# Altium footprint library RPSLib_orignal.PcbLib: 199 footprints (part 10 of 13)
Each footprint in its own frame and in the unit in brackets; x right, y up, seen from the top. Pads: shape width x height; smd on the part's side, far side on the other; paste and mask are expansions set on the pad; w line width, h text height; cw(c..) or ccw(c..) is an arc to the next point about the centre after c.
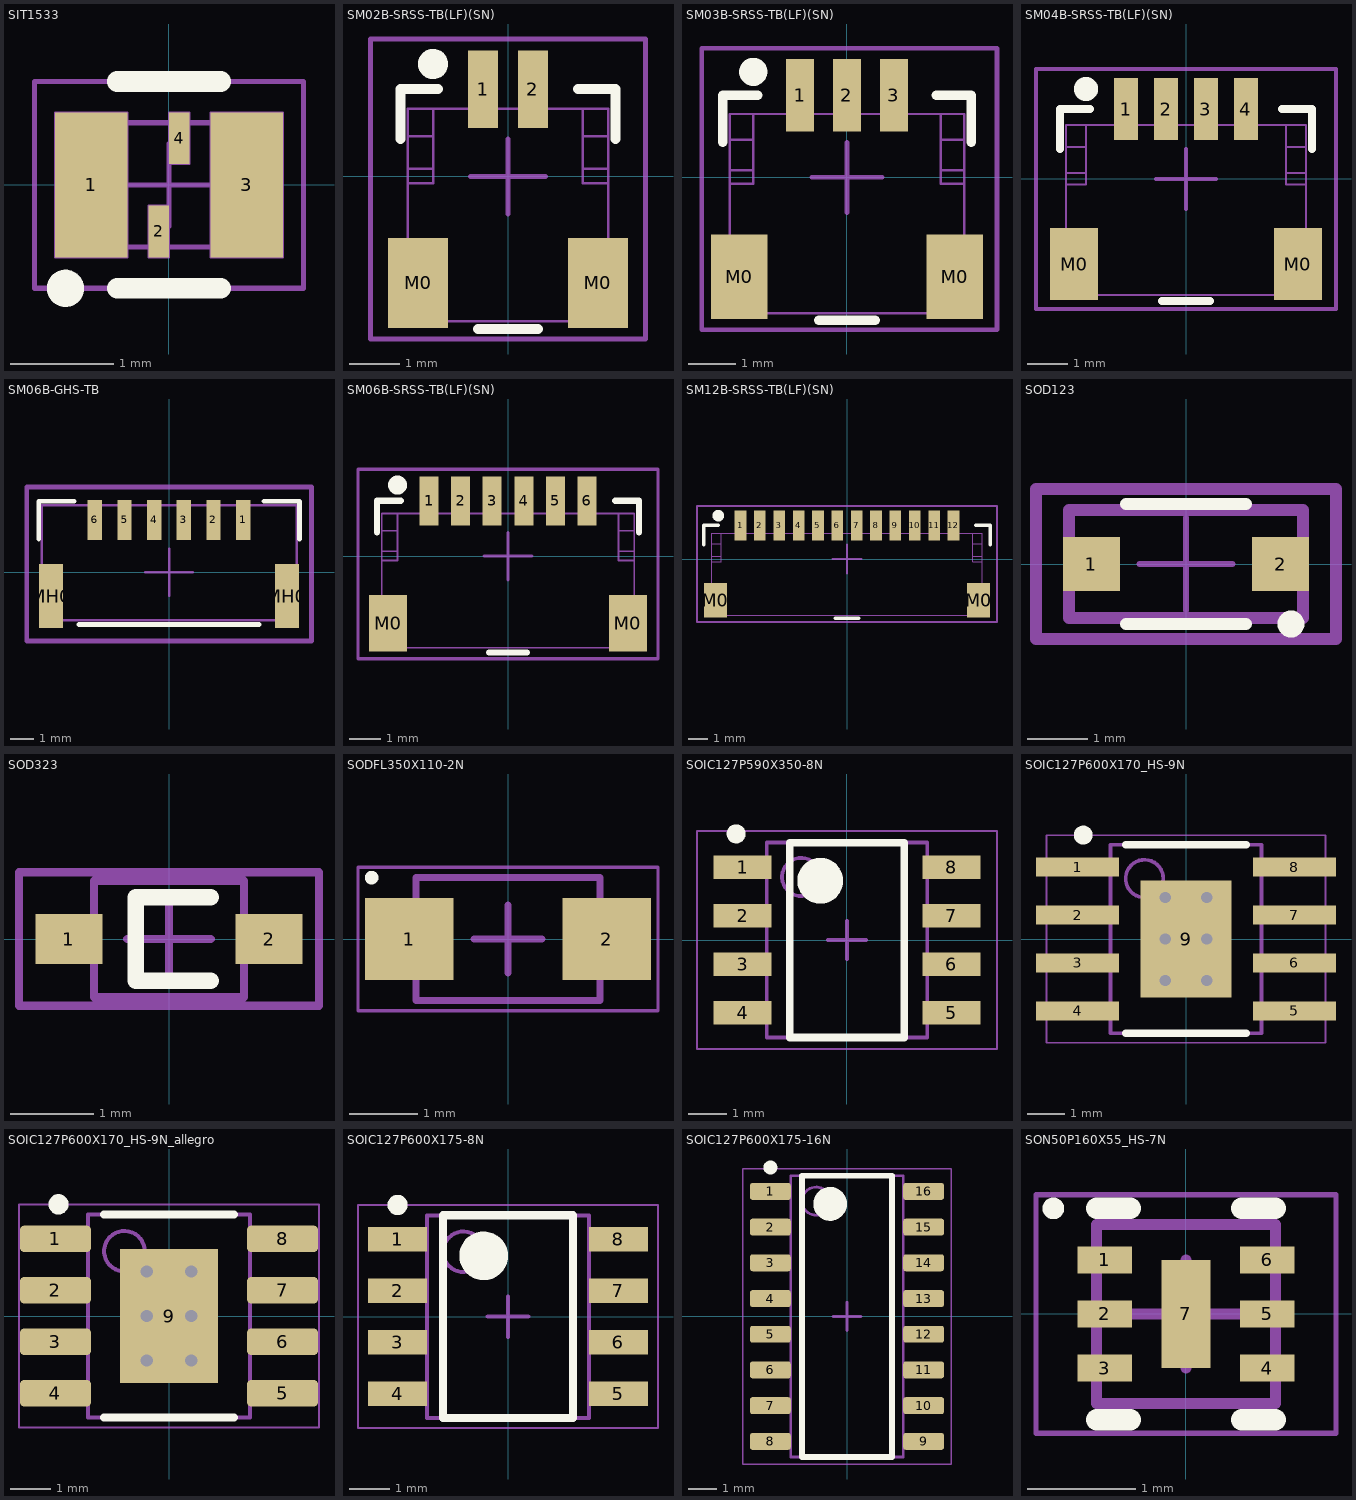
[diagram p9: the footprints below, top view; thin cyan lines are the x and y axes]

## SIT1533 [mm]
height 0.6
pads (4):
  rect 0.7x1.4 smd mask+0.07: 1(-0.75,0) 3(0.75,0)
  rect 0.2x0.5 smd mask+0.07: 2(-0.1,-0.45) 4(0.1,0.45)
Top Overlay:
  circle w0.2: c-1,-1 r0.08
  lines w0.2: -0.5,-1 0.5,-1 ; -0.5,1 0.5,1
Mechanical 1:
  lines w0.02: -1.1,-0.7 -0.4,0.7 ; -1.1,-0.7 -1.1,0.7 ; -1.1,-0.7 -0.4,-0.7 ; -1.1,0.7 -0.4,-0.7 ; -1.1,0.7 -0.4,0.7 ; -0.4,-0.7 -0.4,0.7 ; -0.2,-0.7 0,-0.2 ; -0.2,-0.7 -0.2,-0.2 ; -0.2,-0.7 0,-0.7 ; -0.2,-0.2 0,-0.7 ; -0.2,-0.2 0,-0.2 ; 0,-0.7 0,-0.2 ; 0,0.2 0.2,0.7 ; 0,0.2 0,0.7 ; 0,0.2 0.2,0.2 ; 0,0.7 0.2,0.2 ; 0,0.7 0.2,0.7 ; 0.2,0.2 0.2,0.7 ; 0.4,-0.7 1.1,0.7 ; 0.4,-0.7 0.4,0.7 ; 0.4,-0.7 1.1,-0.7 ; 0.4,0.7 1.1,-0.7 ; 0.4,0.7 1.1,0.7 ; 1.1,-0.7 1.1,0.7
Mechanical 13:
  lines w0.05: -1,-0.6 1,-0.6 1,0.6 -1,0.6 -1,-0.6
Mechanical 15:
  lines w0.05: -0.4,0 0.4,0 ; 0,-0.4 0,0.4 ; -1.3,-1 1.3,-1 1.3,1 -1.3,1 -1.3,-1
3D body "SIT1533.stp": height 0.6, standoff 0, extent -1,-0.6 1,0.6

## SM02B-SRSS-TB(LF)(SN) [mm] "JST 1.0 mm pitch connector"
height 3
pads (4):
  rect 0.6x1.55 smd mask+0.07: 1(-0.5,1.75) 2(0.5,1.75)
  rect 1.2x1.8 smd mask+0.07: M0(-1.8,-2.125) M0(1.8,-2.125)
Top Overlay:
  circle w0.4: c-1.5,2.25 r0.1
  lines w0.2: -2.15,0.75 -2.15,1.75 -1.4,1.75 ; -0.6,-3.05 0.6,-3.05 ; 1.4,1.75 2.15,1.75 2.15,0.75
Mechanical 13:
  lines w0.05: -1.5,0.15 -2,0.15 ; -1.5,0.8 -2,0.8 ; -0.6,1.35 -0.6,2.05 -0.4,2.05 -0.4,1.35 ; 0.4,1.35 0.4,2.05 0.6,2.05 0.6,1.35 ; 1.5,0.15 2,0.15 ; 1.5,0.8 2,0.8 ; -2,-0.139 -2,-2.9 2,-2.9 2,-0.139 ; -2,-0.139 -2,0.15 ; -2,-0.139 -1.5,-0.139 -1.5,1.35 ; -2,0.15 -2,0.8 ; -2,0.8 -2,1.35 -1.5,1.35 ; -1.5,1.35 1.5,1.35 ; 1.5,1.35 1.5,-0.139 2,-0.139 ; 1.5,1.35 2,1.35 2,0.8 ; 2,-0.139 2,0.15 ; 2,0.15 2,0.8
Mechanical 15:
  lines w0.1: -0.75,0 0.75,0 ; 0,-0.75 0,0.75 ; -2.75,-3.25 2.75,-3.25 2.75,2.75 -2.75,2.75 -2.75,-3.25
3D body "SM02B-SRSS-TB.STEP": height 2.96, standoff 0, extent -2,-2.895 2,2.055

## SM03B-SRSS-TB(LF)(SN) [mm] "JST 1.0 mm pitch connector"
height 3
pads (5):
  rect 0.6x1.55 smd mask+0.07: 1(-1,1.75) 2(0,1.75) 3(1,1.75)
  rect 1.2x1.8 smd mask+0.07: M0(-2.3,-2.125) M0(2.3,-2.125)
Top Overlay:
  circle w0.4: c-2,2.25 r0.1
  lines w0.2: -2.65,0.75 -2.65,1.75 -1.9,1.75 ; -0.6,-3.05 0.6,-3.05 ; 1.9,1.75 2.65,1.75 2.65,0.75
Mechanical 13:
  lines w0.05: -2,0.15 -2.5,0.15 ; -2,0.8 -2.5,0.8 ; -1.1,1.35 -1.1,2.05 -0.9,2.05 -0.9,1.35 ; -0.1,1.35 -0.1,2.05 0.1,2.05 0.1,1.35 ; 0.9,1.35 0.9,2.05 1.1,2.05 1.1,1.35 ; 2,0.15 2.5,0.15 ; 2,0.8 2.5,0.8 ; -2.5,-0.139 -2,-0.139 -2,1.35 ; -2.5,-0.139 -2.5,-2.9 2.5,-2.9 2.5,-0.139 ; -2.5,-0.139 -2.5,0.15 ; -2.5,0.15 -2.5,0.8 ; -2.5,0.8 -2.5,1.35 -2,1.35 ; -2,1.35 2,1.35 ; 2,1.35 2.5,1.35 2.5,0.8 ; 2,1.35 2,-0.139 2.5,-0.139 ; 2.5,-0.139 2.5,0.15 ; 2.5,0.15 2.5,0.8
Mechanical 15:
  lines w0.1: -0.75,0 0.75,0 ; 0,-0.75 0,0.75 ; -3.1,-3.25 -3.1,2.75 3.2,2.75 3.2,-3.25 -3.1,-3.25
3D body "SM03B-SRSS-TB.STEP": height 2.96, standoff 0, extent -2.5,-2.895 2.5,2.055

## SM04B-SRSS-TB(LF)(SN) [mm] "JST 1.0 mm pitch connector"
height 3
pads (6):
  rect 0.6x1.55 smd mask+0.07: 1(-1.5,1.75) 2(-0.5,1.75) 3(0.5,1.75) 4(1.5,1.75)
  rect 1.2x1.8 smd mask+0.07: M0(-2.8,-2.125) M0(2.8,-2.125)
Top Overlay:
  circle w0.4: c-2.5,2.25 r0.1
  lines w0.2: -3.15,0.75 -3.15,1.75 -2.4,1.75 ; -0.6,-3.05 0.6,-3.05 ; 2.4,1.75 3.15,1.75 3.15,0.75
Mechanical 13:
  lines w0.05: -2.5,0.15 -3,0.15 ; -2.5,0.8 -3,0.8 ; -1.6,1.35 -1.6,2.05 -1.4,2.05 -1.4,1.35 ; -0.6,1.35 -0.6,2.05 -0.4,2.05 -0.4,1.35 ; 0.4,1.35 0.4,2.05 0.6,2.05 0.6,1.35 ; 1.4,1.35 1.4,2.05 1.6,2.05 1.6,1.35 ; 2.5,0.15 3,0.15 ; 2.5,0.8 3,0.8 ; -3,-0.139 -2.5,-0.139 -2.5,1.35 ; -3,-0.139 -3,0.15 ; -3,-0.139 -3,-2.9 3,-2.9 3,-0.139 ; -3,0.15 -3,0.8 ; -3,0.8 -3,1.35 -2.5,1.35 ; -2.5,1.35 2.5,1.35 ; 2.5,1.35 3,1.35 3,0.8 ; 2.5,1.35 2.5,-0.139 3,-0.139 ; 3,-0.139 3,0.15 ; 3,0.15 3,0.8
Mechanical 15:
  lines w0.1: -0.75,0 0.75,0 ; 0,-0.75 0,0.75 ; -3.75,-3.25 3.75,-3.25 3.75,2.75 -3.75,2.75 -3.75,-3.25
3D body "SM04B-SRSS-TB.STEP": height 2.96, standoff 0, extent -3,-2.895 3,2.055

## SM06B-GHS-TB [mm]
height 4.5
pads (8):
  rect 0.6x1.7 smd mask+0.07: 1(3.12,2.208) 2(1.87,2.208) 3(0.62,2.208) 4(-0.63,2.208) 5(-1.88,2.208) 6(-3.13,2.208)
  rect 1x2.7 smd mask+0.07: MH0(-4.978,-1) MH0(4.967,-1)
Top Overlay:
  lines w0.2: -5.5,1.4 -5.5,3 -4,3 ; -3.8,-2.2 3.8,-2.2 ; 4,3 5.5,3 5.5,1.4
Mechanical 13:
  lines w0.1: -5.375,-2.025 5.375,-2.025 5.375,2.825 -5.375,2.825 -5.375,-2.025
Mechanical 15:
  lines w0.1: -1,0 1,0 ; 0,-1 0,1
  lines w0.2: -6,-2.9 6,-2.9 6,3.6 -6,3.6 -6,-2.9
3D body "SM06B-GHS-TB_norm.stp": height 4.35, standoff 0, extent -5.375,-2.025 5.375,2.825

## SM06B-SRSS-TB(LF)(SN) [mm] "JST 1.0 mm pitch connector"
height 3
pads (8):
  rect 0.6x1.55 smd mask+0.07: 1(-2.5,1.75) 2(-1.5,1.75) 3(-0.5,1.75) 4(0.5,1.75) 5(1.5,1.75) 6(2.5,1.75)
  rect 1.2x1.8 smd mask+0.07: M0(-3.8,-2.125) M0(3.8,-2.125)
Top Overlay:
  circle w0.4: c-3.5,2.25 r0.1
  lines w0.2: -4.15,0.75 -4.15,1.75 -3.4,1.75 ; -0.6,-3.05 0.6,-3.05 ; 3.4,1.75 4.15,1.75 4.15,0.75
Mechanical 13:
  lines w0.05: -3.5,0.15 -4,0.15 ; -3.5,0.8 -4,0.8 ; -2.6,1.35 -2.6,2.05 -2.4,2.05 -2.4,1.35 ; -1.6,1.35 -1.6,2.05 -1.4,2.05 -1.4,1.35 ; -0.6,1.35 -0.6,2.05 -0.4,2.05 -0.4,1.35 ; 0.4,1.35 0.4,2.05 0.6,2.05 0.6,1.35 ; 1.4,1.35 1.4,2.05 1.6,2.05 1.6,1.35 ; 2.4,1.35 2.4,2.05 2.6,2.05 2.6,1.35 ; 3.5,0.15 4,0.15 ; 3.5,0.8 4,0.8 ; -4,-0.139 -3.5,-0.139 -3.5,1.35 ; -4,-0.139 -4,0.15 ; -4,-0.139 -4,-2.9 4,-2.9 4,-0.139 ; -4,0.15 -4,0.8 ; -4,0.8 -4,1.35 -3.5,1.35 ; -3.5,1.35 3.5,1.35 ; 3.5,1.35 4,1.35 4,0.8 ; 3.5,1.35 3.5,-0.139 4,-0.139 ; 4,-0.139 4,0.15 ; 4,0.15 4,0.8
Mechanical 15:
  lines w0.1: -0.75,0 0.75,0 ; 0,-0.75 0,0.75 ; -4.75,-3.25 4.75,-3.25 4.75,2.75 -4.75,2.75 -4.75,-3.25
3D body "SM06B-SRSS-TB.STEP": height 2.96, standoff 0, extent -4,-2.895 4,2.055

## SM12B-SRSS-TB(LF)(SN) [mm] "JST 1.0 mm pitch connector"
height 3
pads (14):
  rect 0.6x1.55 smd mask+0.07: 1(-5.5,1.75) 2(-4.5,1.75) 3(-3.5,1.75) 4(-2.5,1.75) 5(-1.5,1.75) 6(-0.5,1.75) 7(0.5,1.75) 8(1.5,1.75) 9(2.5,1.75) 10(3.5,1.75) 11(4.5,1.75) 12(5.5,1.75)
  rect 1.2x1.8 smd mask+0.07: M0(-6.8,-2.125) M0(6.8,-2.125)
Top Overlay:
  circle w0.4: c-6.65,2.25 r0.1
  lines w0.2: -7.4,0.75 -7.4,1.75 -6.65,1.75 ; -0.6,-3.05 0.6,-3.05 ; 6.65,1.75 7.4,1.75 7.4,0.75
Mechanical 13:
  lines w0.05: -6.5,0.15 -7,0.15 ; -6.5,0.8 -7,0.8 ; -5.6,1.35 -5.6,2.05 -5.4,2.05 -5.4,1.35 ; -4.6,1.35 -4.6,2.05 -4.4,2.05 -4.4,1.35 ; -3.6,1.35 -3.6,2.05 -3.4,2.05 -3.4,1.35 ; -2.6,1.35 -2.6,2.05 -2.4,2.05 -2.4,1.35 ; -1.6,1.35 -1.6,2.05 -1.4,2.05 -1.4,1.35 ; -0.6,1.35 -0.6,2.05 -0.4,2.05 -0.4,1.35 ; 0.4,1.35 0.4,2.05 0.6,2.05 0.6,1.35 ; 1.4,1.35 1.4,2.05 1.6,2.05 1.6,1.35 ; 2.4,1.35 2.4,2.05 2.6,2.05 2.6,1.35 ; 3.4,1.35 3.4,2.05 3.6,2.05 3.6,1.35 ; 4.4,1.35 4.4,2.05 4.6,2.05 4.6,1.35 ; 5.4,1.35 5.4,2.05 5.6,2.05 5.6,1.35 ; 6.5,0.15 7,0.15 ; 6.5,0.8 7,0.8 ; -7,-0.139 -6.5,-0.139 -6.5,1.35 ; -7,-0.139 -7,0.15 ; -7,-0.139 -7,-2.9 7,-2.9 7,-0.139 ; -7,0.15 -7,0.8 ; -7,0.8 -7,1.35 -6.5,1.35 ; -6.5,1.35 6.5,1.35 ; 6.5,1.35 7,1.35 7,0.8 ; 6.5,1.35 6.5,-0.139 7,-0.139 ; 7,-0.139 7,0.15 ; 7,0.15 7,0.8
Mechanical 15:
  lines w0.1: -0.75,0 0.75,0 ; 0,-0.75 0,0.75 ; -7.75,-3.25 7.75,-3.25 7.75,2.75 -7.75,2.75 -7.75,-3.25
3D body "SM12B-SRSS-TB.STEP": height 2.96, standoff 0, extent -7,-2.895 7,2.055

## SOD123 [mm]
pads (2):
  rect 0.95x0.9 smd mask+0.075: 1(-1.575,0) 2(1.575,0)
Top Overlay:
  circle w0.25: c1.75,-1 r0.1
  lines w0.2: -1,-1 1,-1 ; -1,1 1,1
Mechanical 13:
  lines w0.2: -1.95,-0.9 -1.95,0.9 1.95,0.9 1.95,-0.9 -1.95,-0.9
Mechanical 15:
  lines w0.1: -0.775,0 0.775,0 ; 0,-0.775 0,0.775
  lines w0.2: -2.5,-1.25 -2.5,1.25 2.5,1.25 2.5,-1.25 -2.5,-1.25
3D body "User Library-SOD123-1.step": height 1.18, standoff 0, extent -1.95,-0.9 1.95,0.9

## SOD323 [mm]
pads (2):
  rect 0.8x0.6 smd mask+0.07: 1(-1.2,0) 2(1.2,0)
Top Overlay:
  lines w0.2: 0.5,-0.5 -0.4,-0.5 -0.4,0.5 0.5,0.5
Mechanical 13:
  lines w0.1: -0.9,-0.7 0.9,-0.7 0.9,0.7 -0.9,0.7 -0.9,-0.7
Mechanical 15:
  lines w0.1: -0.5,0 0.5,0 ; 0,-0.5 0,0.5 ; -1.8,-0.8 1.8,-0.8 1.8,0.8 -1.8,0.8 -1.8,-0.8

## SODFL350X110-2N [mm] "SODFL, 2-Leads, Body 1,65x3,50mm, IPC Medium Density"
height 1.1
pads (2):
  rect 1.3x1.2 smd paste-0.05 mask+0.075: 1(-1.45,0) 2(1.45,0)
Top Overlay:
  circle w0.1: c-2,0.9 r0.05
Mechanical 13:
  lines w0.1: -1.35,-0.9 1.35,-0.9 1.35,0.9 -1.35,0.9 -1.35,-0.9
Mechanical 15:
  lines w0.05: -2.2,-1.05 2.2,-1.05 2.2,1.05 -2.2,1.05 -2.2,-1.05
  lines w0.1: -0.5,0 0.5,0 ; 0,-0.5 0,0.5
3D body "User Library-SOD123F.step": height 1.2, standoff -0.01, extent -1.9,-0.85 1.85,0.85

## SOIC127P590X350-8N [mm] "SOIC, 8-Leads, Body 4,88x3,91mm, Pitch 1,27mm, IPC Medium Density"
height 3.5
pads (8):
  rect 1.52x0.61 smd mask+0.07: 1(-2.73,1.905) 2(-2.73,0.635) 3(-2.73,-0.635) 4(-2.73,-1.905) 5(2.73,-1.905) 6(2.73,-0.635) 7(2.73,0.635) 8(2.73,1.905)
Top Overlay:
  circle w0.6: c-0.7,1.55 r0.3
  circle w0.25: c-2.9,2.78 r0.125
  lines w0.2: -1.5,-2.55 1.5,-2.55 1.5,2.55 -1.5,2.55 -1.5,-2.55
Mechanical 13:
  circle w0.1: c-1.2,1.65 r0.5
  lines w0.1: -2.1,-2.55 2.1,-2.55 2.1,2.55 -2.1,2.55 -2.1,-2.55
Mechanical 15:
  lines w0.05: -3.925,-2.85 3.925,-2.85 3.925,2.85 -3.925,2.85 -3.925,-2.85
  lines w0.1: -0.5,0 0.5,0 ; 0,-0.5 0,0.5
3D body "SOIC127P590X350-8N.step": height 3.5, standoff 0.02, extent -2.94,-2.55 2.94,2.55

## SOIC127P600X170_HS-9N [mm] "SOIC, 8-Leads, Body 4,90x3,90mm, Pitch 1,27mm, Thermal Pad 3,10x2,40mm, IPC Medium Density"
height 1.7
pads (9):
  rect 2.2x0.5 smd mask+0.07: 1(-2.875,1.905) 2(-2.875,0.635) 3(-2.875,-0.635) 4(-2.875,-1.905) 5(2.875,-1.905) 6(2.875,-0.635) 7(2.875,0.635) 8(2.875,1.905)
  rect 2.4x3.1 smd: 9(0,0)
via -0.55,1.1 diameter 0.6 hole 0.3
via 0.55,1.1 diameter 0.6 hole 0.3
via -0.55,0 diameter 0.6 hole 0.3
via 0.55,0 diameter 0.6 hole 0.3
via -0.55,-1.1 diameter 0.6 hole 0.3
via 0.55,-1.1 diameter 0.6 hole 0.3
Top Overlay:
  circle w0.25: c-2.725,2.755 r0.125
  lines w0.2: -1.6,-2.5 1.6,-2.5 ; -1.6,2.5 1.6,2.5
Mechanical 13:
  circle w0.1: c-1.1,1.6 r0.5
  lines w0.1: -2,-2.5 -2,2.5 2,2.5 2,-2.5 -2,-2.5
Mechanical 15:
  lines w0.05: -3.7,-2.75 -3.7,2.75 3.7,2.75 3.7,-2.75 -3.7,-2.75
  lines w0.1: -0.5,0 0.5,0 ; 0,-0.5 0,0.5
3D body "SOIC127P600X170_HS-9N.step": height 1.7, standoff 0, extent -3,-2.5 3,2.5

## SOIC127P600X170_HS-9N_allegro [mm] "SOIC, 8-Leads, Body 4,90x3,90mm, Pitch 1,27mm, Thermal Pad 3,30x2,41mm, IPC Medium Density"
height 1.7
pads (9):
  rrect30% 1.75x0.65 smd mask+0.07: 1(-2.8,1.905) 2(-2.8,0.635) 3(-2.8,-0.635) 4(-2.8,-1.905) 5(2.8,-1.905) 6(2.8,-0.635) 7(2.8,0.635) 8(2.8,1.905)
  rect 2.41x3.3 smd mask+0.07: 9(0,0)
via -0.55,1.1 diameter 0.7 hole 0.3
via 0.55,1.1 diameter 0.7 hole 0.3
via -0.55,0 diameter 0.7 hole 0.3
via 0.55,0 diameter 0.7 hole 0.3
via -0.55,-1.1 diameter 0.7 hole 0.3
via 0.55,-1.1 diameter 0.7 hole 0.3
Top Overlay:
  circle w0.25: c-2.725,2.755 r0.125
  lines w0.2: -1.6,-2.5 1.6,-2.5 ; -1.6,2.5 1.6,2.5
Mechanical 13:
  circle w0.1: c-1.1,1.6 r0.5
  lines w0.1: -2,-2.5 -2,2.5 2,2.5 2,-2.5 -2,-2.5
Mechanical 15:
  lines w0.05: -3.7,-2.75 -3.7,2.75 3.7,2.75 3.7,-2.75 -3.7,-2.75
  lines w0.1: -0.5,0 0.5,0 ; 0,-0.5 0,0.5
3D body "SOIC127P600X170_HS-9N_allegro.step": height 1.7, standoff 0, extent -3,-2.5 3,2.5

## SOIC127P600X175-8N [mm] "SOIC, 8-Leads, Body 4.90x3.90mm, Pitch 1.27mm, IPC Medium Density"
height 1.75
pads (8):
  rect 1.45x0.6 smd paste-0.05: 1(-2.725,1.905) 2(-2.725,0.635) 3(-2.725,-0.635) 4(-2.725,-1.905) 5(2.725,-1.905) 6(2.725,-0.635) 7(2.725,0.635) 8(2.725,1.905)
Top Overlay:
  circle w0.6: c-0.6,1.5 r0.3
  circle w0.25: c-2.725,2.755 r0.125
  lines w0.2: -1.6,-2.5 1.6,-2.5 1.6,2.5 -1.6,2.5 -1.6,-2.5
Mechanical 13:
  circle w0.1: c-1.1,1.6 r0.5
  lines w0.1: -2,-2.5 2,-2.5 2,2.5 -2,2.5 -2,-2.5
Mechanical 15:
  lines w0.05: -3.7,-2.75 3.7,-2.75 3.7,2.75 -3.7,2.75 -3.7,-2.75
  lines w0.1: -0.5,0 0.5,0 ; 0,-0.5 0,0.5
3D body "SOIC127P600X175-8N.step": height 1.75, standoff 0, extent -3,-2.5 3,2.5

## SOIC127P600X175-16N [mm] "SOIC, 16-Leads, Body 9,90x3,90mm, Pitch 1,27mm, IPC Medium Density"
height 1.75
pads (16):
  rrect30% 1.45x0.6 smd paste-0.05 mask+0.07: 1(-2.725,4.445) 2(-2.725,3.175) 3(-2.725,1.905) 4(-2.725,0.635) 5(-2.725,-0.635) 6(-2.725,-1.905) 7(-2.725,-3.175) 8(-2.725,-4.445) 9(2.725,-4.445) 10(2.725,-3.175) 11(2.725,-1.905) 12(2.725,-0.635) 13(2.725,0.635) 14(2.725,1.905) 15(2.725,3.175) 16(2.725,4.445)
Top Overlay:
  circle w0.6: c-0.6,4 r0.3
  circle w0.25: c-2.725,5.295 r0.125
  lines w0.2: -1.6,-5 1.6,-5 1.6,5 -1.6,5 -1.6,-5
Mechanical 13:
  circle w0.1: c-1.1,4.1 r0.5
  lines w0.1: -2,-5 2,-5 2,5 -2,5 -2,-5
Mechanical 15:
  lines w0.05: -3.7,-5.25 3.7,-5.25 3.7,5.25 -3.7,5.25 -3.7,-5.25
  lines w0.1: -0.5,0 0.5,0 ; 0,-0.5 0,0.5
3D body "SOIC127P600X175-16N.step": height 1.75, standoff 0, extent -3,-5 3,5

## SON50P160X55_HS-7N [mm] "SON, 6-Leads, Body 1,60x1,60mm, Pitch 0,50mm, Thermal Pad 1,00x0,43mm, IPC Medium Density"
height 0.55
pads (7):
  rect 0.5x0.25 smd mask+0.07: 1(-0.75,0.5) 2(-0.75,0) 3(-0.75,-0.5) 4(0.75,-0.5) 5(0.75,0) 6(0.75,0.5)
  rect 0.45x1 smd mask+0.07: 7(0,0)
Top Overlay:
  circle w0.1: c-1.225,0.975 r0.05
  lines w0.2: -0.825,-0.975 -0.515,-0.975 ; -0.825,0.975 -0.515,0.975 ; 0.515,-0.975 0.825,-0.975 ; 0.515,0.975 0.825,0.975
Mechanical 13:
  lines w0.1: -0.825,-0.825 0.825,-0.825 0.825,0.825 -0.825,0.825 -0.825,-0.825
Mechanical 15:
  lines w0.05: -1.385,-1.1 1.385,-1.1 1.385,1.1 -1.385,1.1 -1.385,-1.1
  lines w0.1: -0.5,0 0.5,0 ; 0,-0.5 0,0.5
3D body "SON50P160X55_HS-7N.step": height 0.55, standoff 0, extent -0.875,-0.825 0.875,0.825